# Altium footprint library Generic Footprint.PcbLib: 160 footprints (part 12 of 20)
Each footprint in its own frame and in the unit in brackets; x right, y up, seen from the top. Pads: shape width x height; smd on the part's side, far side on the other; paste and mask are expansions set on the pad; w line width, h text height; cw(c..) or ccw(c..) is an arc to the next point about the centre after c.
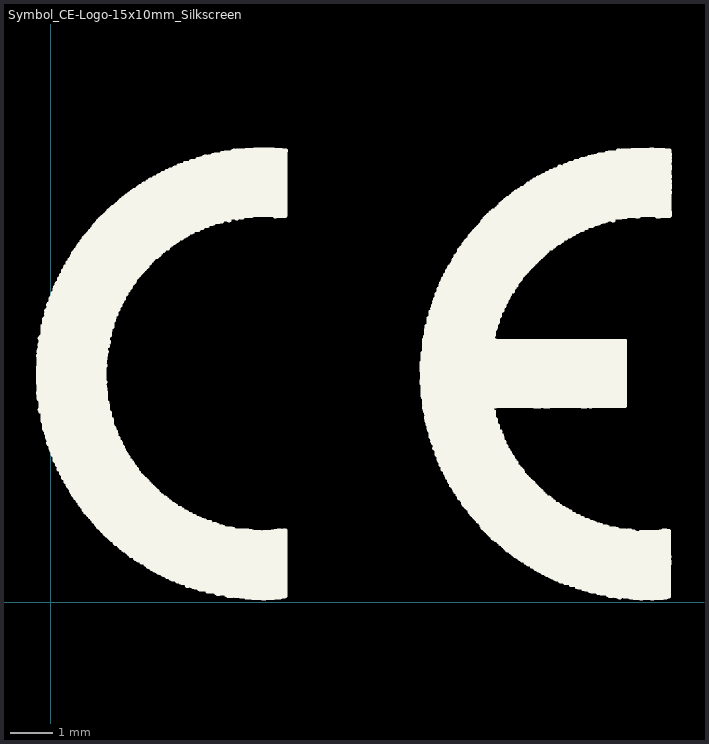
[diagram p11: the footprint, top view; thin cyan lines are the x and y axes]

## Symbol_CE-Logo-15x10mm_Silkscreen [mil]
pads (3108):
  round 3.94 on Top Overlay: 1(-11.54,192.48) 1(-11.54,201.34) 1(-11.54,201.93) 1(-11.54,202.52) 1(-11.54,203.11) 1(-11.54,203.7) 1(-11.54,204.29) 1(-11.54,204.88) 1(-11.54,206.65) 1(-11.54,207.24) 1(-11.54,207.83) 1(-11.54,208.43) 1(-11.54,209.02) 1(-11.54,209.61) 1(-11.54,210.2) 1(-11.54,210.79) 1(-11.54,211.38) 1(-11.54,211.97) 1(-11.54,212.56) 1(-11.54,213.15) 1(-11.54,213.74) 1(-11.54,214.33) 1(-11.54,214.92) 1(-11.54,215.51) 1(-11.54,216.1) 1(-11.54,226.73) 1(-10.95,187.76) 1(-10.95,188.35) 1(-10.95,188.94) 1(-10.95,189.53) 1(-10.95,190.12) 1(-10.95,193.07) 1(-10.95,193.66) 1(-10.95,194.25) 1(-10.95,194.84) 1(-10.95,195.43) 1(-10.95,196.02) 1(-10.95,196.61) 1(-10.95,197.2) 1(-10.95,197.8) 1(-10.95,198.39) 1(-10.95,198.98) 1(-10.95,199.57) 1(-10.95,200.16) 1(-10.95,200.75) 1(-10.95,205.47) 1(-10.95,206.06) 1(-10.95,216.69) 1(-10.95,217.28) 1(-10.95,217.87) 1(-10.95,218.46) 1(-10.95,219.06) 1(-10.95,219.65) 1(-10.95,220.24) 1(-10.95,220.83) 1(-10.95,221.42) 1(-10.95,222.01) 1(-10.95,222.6) 1(-10.95,223.19) 1(-10.95,223.78) 1(-10.95,224.37) 1(-10.95,224.96) 1(-10.95,225.55) 1(-10.95,226.14) 1(-10.95,230.28) 1(-10.95,230.87) 1(-10.36,186.57) 1(-10.36,187.17) 1(-10.36,190.71) 1(-10.36,191.3) 1(-10.36,191.89) 1(-10.36,227.32) 1(-10.36,227.91) 1(-10.36,228.5) 1(-10.36,229.09) 1(-10.36,229.69) 1(-10.36,231.46) 1(-10.36,232.05) 1(-10.36,232.64) 1(-9.77,177.13) 1(-9.77,233.23) 1(-9.77,236.18) 1(-9.77,236.77) 1(-9.77,237.36) 1(-9.77,242.68) 1(-9.18,175.35) 1(-9.18,175.94) 1(-9.18,176.54) 1(-9.18,178.9) 1(-9.18,179.49) 1(-9.18,180.08) 1(-9.18,180.67) 1(-9.18,181.26) 1(-9.18,181.85) 1(-9.18,182.44) 1(-9.18,183.03) 1(-9.18,183.62) 1(-9.18,184.21) 1(-9.18,184.8) 1(-9.18,185.39) 1(-9.18,185.98) 1(-9.18,233.82) 1(-9.18,234.41) 1(-9.18,235) 1(-9.18,235.59) 1(-9.18,237.95) 1(-9.18,238.54) 1(-9.18,239.13) 1(-9.18,239.72) 1(-9.18,240.31) 1(-8.59,177.72) 1(-8.59,178.31) 1(-8.59,240.91) 1(-8.59,241.5) 1(-8.59,242.09) 1(-8.59,243.27) 1(-8.59,243.86) 1(-8.59,244.45) 1(-7.41,167.09) 1(-7.41,167.68) 1(-7.41,168.27) 1(-7.41,168.86) 1(-7.41,169.45) 1(-7.41,170.04) 1(-7.41,170.63) 1(-7.41,171.22) 1(-7.41,171.81) 1(-7.41,172.4) 1(-7.41,172.99) 1(-7.41,173.58) 1(-7.41,174.76) 1(-7.41,245.04) 1(-7.41,245.63) 1(-7.41,246.22) 1(-7.41,246.81) 1(-7.41,247.4) 1(-7.41,247.99) 1(-7.41,248.58) 1(-7.41,249.17) 1(-7.41,249.76) 1(-7.41,250.35) 1(-7.41,250.94) 1(-7.41,251.54) 1(-7.41,253.9) 1(-6.82,165.91) 1(-6.82,166.5) 1(-6.82,174.17) 1(-6.82,252.13) 1(-6.82,252.72) 1(-6.82,253.31) 1(-5.63,159.41) 1(-5.63,160.59) 1(-5.63,161.18) 1(-5.63,161.77) 1(-5.63,162.36) 1(-5.63,162.95) 1(-5.63,163.54) 1(-5.63,164.13) 1(-5.63,164.72) 1(-5.63,165.31) 1(-5.63,254.49) 1(-5.63,255.08) 1(-5.63,255.67) 1(-5.63,256.26) 1(-5.63,256.85) 1(-5.63,257.44) 1(-5.63,258.03) 1(-5.63,258.62) 1(-5.63,259.21) 1(-5.63,260.39) 1(-5.04,158.23) 1(-5.04,158.82) 1(-5.04,160) 1(-5.04,259.8) 1(-5.04,260.98) 1(-4.45,261.57) 1(-3.86,155.28) 1(-3.86,155.87) 1(-3.86,156.46) 1(-3.86,157.64) 1(-3.86,264.53) 1(-3.86,265.12) 1(-3.86,265.71) 1(-3.86,268.07) 1(-3.27,151.73) 1(-3.27,152.32) 1(-3.27,152.91) 1(-3.27,153.5) 1(-3.27,154.09) 1(-3.27,154.68) 1(-3.27,157.05) 1(-3.27,262.17) 1(-3.27,262.76) 1(-3.27,263.35) 1(-3.27,263.94) 1(-3.27,266.3) 1(-3.27,266.89) 1(-3.27,267.48) 1(-2.68,150.55) 1(-2.68,151.14) 1(-2.68,268.66) 1(-2.68,269.25) 1(-2.09,146.42) 1(-2.09,273.39) 1(-1.5,145.24) 1(-1.5,145.83) 1(-1.5,147.01) 1(-1.5,147.6) 1(-1.5,148.19) 1(-1.5,148.78) 1(-1.5,149.37) 1(-1.5,149.96) 1(-1.5,269.84) 1(-1.5,270.43) 1(-1.5,271.02) 1(-1.5,271.61) 1(-1.5,272.2) 1(-1.5,272.8) 1(-1.5,274.57) 1(-0.91,144.65) 1(-0.91,273.98) 1(0.27,141.1) 1(0.27,141.69) 1(0.27,142.28) 1(0.27,142.87) 1(0.27,143.46) 1(0.27,144.06) 1(0.27,275.16) 1(0.27,275.75) 1(0.27,276.34) 1(0.27,276.93) 1(0.27,277.52) 1(0.27,278.11) 1(0.27,278.7) 1(0.27,279.29) 1(0.86,139.33) 1(0.86,139.92) 1(0.86,140.51) 1(0.86,279.88) 1(0.86,280.47) 1(1.45,138.74) 1(2.04,135.79) 1(2.04,136.97) 1(2.04,138.15) 1(2.04,281.06) 1(2.04,281.65) 1(2.04,282.83) 1(2.04,284.02) 1(2.63,136.38) 1(2.63,137.56) 1(2.63,282.24) 1(2.63,283.43) 1(3.22,135.2) 1(3.81,130.47) 1(3.81,131.06) 1(3.81,131.65) 1(3.81,132.24) 1(3.81,132.83) 1(3.81,133.43) 1(3.81,134.02) 1(3.81,134.61) 1(3.81,284.61) 1(3.81,285.2) 1(3.81,285.79) 1(3.81,286.38) 1(3.81,286.97) 1(3.81,287.56) 1(3.81,288.15) 1(4.4,129.88) 1(4.4,288.74) 1(4.4,289.92) 1(5,129.29) 1(5,289.33) 1(5.59,290.51) 1(5.59,292.28) 1(6.18,126.34) 1(6.18,126.93) 1(6.18,127.52) 1(6.18,128.11) 1(6.18,128.7) 1(6.18,291.1) 1(6.18,291.69) 1(6.18,292.87) 1(6.18,293.46) 1(6.77,125.75) 1(7.36,122.2) 1(7.36,294.06) 1(7.95,122.8) 1(7.95,123.39) 1(7.95,123.98) 1(7.95,124.57) 1(7.95,125.16) 1(7.95,294.65) 1(7.95,295.24) 1(7.95,295.83) 1(7.95,296.42) 1(7.95,297.01) 1(7.95,297.6) 1(9.13,121.61) 1(9.72,118.66) 1(9.72,119.25) 1(9.72,119.84) 1(9.72,120.43) 1(9.72,121.02) 1(9.72,298.19) 1(9.72,298.78) 1(9.72,299.37) 1(9.72,299.96) 1(9.72,300.55) 1(10.31,118.07) 1(10.31,301.14) 1(11.49,114.53) 1(11.49,115.12) 1(11.49,115.71) 1(11.49,116.3) 1(11.49,116.89) 1(11.49,117.48) 1(11.49,301.73) 1(11.49,302.32) 1(11.49,302.91) 1(11.49,303.5) 1(11.49,304.09) 1(11.49,304.69) 1(12.08,305.28) 1(12.67,113.94) 1(13.26,113.35) 1(13.26,305.87) 1(13.26,306.46) 1(13.26,307.64) 1(13.85,110.98) 1(13.85,111.57) 1(13.85,112.17) 1(13.85,112.76) 1(13.85,307.05) 1(13.85,308.23) 1(13.85,308.82) 1(14.44,110.39) 1(15.63,108.03) 1(15.63,108.62) 1(15.63,109.21) 1(15.63,109.8) 1(15.63,309.41) 1(15.63,310) 1(15.63,310.59) 1(15.63,311.18) 1(15.63,311.77) 1(15.63,312.36) 1(16.22,106.85) 1(16.22,107.44) 1(16.81,312.95) 1(17.4,105.67) 1(17.4,106.26) 1(17.4,313.54) 1(17.4,314.13) 1(17.4,314.72) 1(17.99,105.08) 1(19.17,102.13) 1(19.17,102.72) 1(19.17,103.31) 1(19.17,103.9) 1(19.17,104.49) 1(19.17,315.31) 1(19.17,315.91) 1(19.17,316.5) 1(19.76,100.94) 1(19.76,101.54) 1(19.76,317.09) 1(19.76,317.68) 1(19.76,318.27) 1(20.94,98.58) 1(20.94,99.17) 1(20.94,99.76) 1(20.94,100.35) 1(20.94,318.86) 1(20.94,319.45) 1(20.94,320.04) 1(20.94,320.63) 1(20.94,321.22) 1(21.53,97.99) 1(21.53,321.81) 1(22.12,97.4) 1(22.12,322.4) 1(22.71,96.22) 1(22.71,96.81) 1(22.71,322.4) 1(23.3,95.63) 1(23.3,322.4) 1(23.3,322.99) 1(23.3,323.58) 1(23.3,324.17) 1(24.48,324.76) 1(25.07,93.27) 1(25.07,93.86) 1(25.07,94.45) 1(25.07,95.04) 1(25.07,325.35) 1(25.07,325.94) 1(25.07,326.54) 1(25.66,327.13) 1(25.66,327.72) 1(26.85,90.31) 1(26.85,90.91) 1(26.85,91.5) 1(26.85,92.09) 1(26.85,92.68) 1(26.85,328.31) 1(26.85,328.9) 1(26.85,329.49) 1(27.44,89.72) 1(28.62,88.54) 1(28.62,89.13) 1(28.62,330.08) 1(28.62,330.67) 1(28.62,331.85) 1(29.21,87.95) 1(29.21,331.26) 1(30.39,85.59) 1(30.39,86.18) 1(30.39,86.77) 1(30.39,87.36) 1(30.39,332.44) 1(30.39,333.03) 1(30.39,333.62) 1(30.39,334.21) 1(30.98,84.41) 1(30.98,85) 1(30.98,334.8) 1(30.98,335.39) 1(32.16,82.64) 1(32.16,83.82) 1(32.16,335.98) 1(32.75,83.23) 1(32.75,336.57) 1(32.75,337.17) 1(33.34,82.05) 1(34.52,80.28) 1(34.52,80.87) 1(34.52,81.46) 1(34.52,337.76) 1(34.52,338.35) 1(34.52,338.94) 1(35.11,339.53) 1(36.29,78.5) 1(36.29,79.09) 1(36.29,79.68) 1(36.29,340.12) 1(36.29,340.71) 1(36.29,341.3) 1(38.07,76.73) 1(38.07,77.32) 1(38.07,77.91) 1(38.07,341.89) 1(38.07,342.48) 1(38.07,343.07) 1(39.25,76.14) 1(39.84,74.37) 1(39.84,74.96) 1(39.84,75.55) 1(39.84,343.66) 1(39.84,344.25) 1(39.84,344.84) 1(39.84,345.43) 1(40.43,346.02) 1(40.43,346.61) 1(41.02,74.37) 1(41.61,72.6) 1(41.61,74.37) 1(41.61,347.2) 1(42.2,71.42) 1(42.2,72.01) 1(42.2,73.19) 1(42.2,73.78) 1(42.2,347.8) 1(42.2,348.39) 1(42.79,70.83) 1(42.79,348.98) 1(43.97,69.06) 1(43.97,69.65) 1(43.97,70.24) 1(43.97,349.57) 1(43.97,350.16) 1(43.97,350.75) 1(45.15,68.46) 1(45.74,351.34) 1(45.74,351.93) 1(45.74,352.52) 1(46.33,67.28) 1(46.33,67.87) 1(46.92,66.69) 1(47.52,65.51) 1(47.52,66.1) 1(47.52,353.11) 1(47.52,353.7) 1(47.52,354.29) 1(48.7,64.92) 1(49.29,64.33) 1(49.29,199.57) 1(49.29,200.16) 1(49.29,200.75) 1(49.29,201.34) 1(49.29,203.7) 1(49.29,204.29) 1(49.29,204.88) 1(49.29,205.47) 1(49.29,206.06) 1(49.29,206.65) 1(49.29,207.24) 1(49.29,207.83) 1(49.29,208.43) 1(49.29,209.02) 1(49.29,209.61) 1(49.29,210.2) 1(49.29,210.79) 1(49.29,211.38) 1(49.29,211.97) 1(49.29,212.56) 1(49.29,213.15) 1(49.29,213.74) 1(49.29,214.33) 1(49.29,214.92) 1(49.29,215.51) 1(49.29,216.1) 1(49.29,218.46) 1(49.29,219.06) 1(49.29,219.65) 1(49.29,220.24) 1(49.29,354.88) 1(49.29,355.47) 1(49.88,63.15) 1(49.88,63.74) 1(49.88,197.2) 1(49.88,197.8) 1(49.88,198.39) 1(49.88,198.98) 1(49.88,201.93) 1(49.88,203.11) 1(49.88,216.69) 1(49.88,220.83) 1(49.88,221.42) 1(49.88,222.01) 1(49.88,222.6) 1(49.88,223.19) 1(49.88,356.06) 1(50.47,191.3) 1(50.47,191.89) 1(50.47,192.48) 1(50.47,193.66) 1(50.47,194.25) 1(50.47,194.84) 1(50.47,195.43) 1(50.47,196.02) 1(50.47,196.61) 1(50.47,202.52) 1(50.47,217.28) 1(50.47,217.87) 1(50.47,223.78) 1(50.47,224.37) 1(50.47,224.96) 1(50.47,225.55) 1(50.47,226.14) 1(50.47,226.73) 1(50.47,227.91) 1(50.47,228.5) 1(50.47,229.09) 1(50.47,229.69) 1(50.47,232.05) 1(50.47,235) 1(51.06,184.21) 1(51.06,184.8) 1(51.06,185.39) 1(51.06,185.98) 1(51.06,186.57) 1(51.06,187.17) 1(51.06,187.76) 1(51.06,188.35) 1(51.06,188.94) 1(51.06,189.53) 1(51.06,190.12) 1(51.06,190.71) 1(51.06,193.07) 1(51.06,227.32) 1(51.06,230.87) 1(51.06,231.46) 1(51.06,232.64) 1(51.06,233.23) 1(51.06,233.82) 1(51.06,234.41) 1(51.06,356.65) 1(51.65,61.38) 1(51.65,61.97) 1(51.65,62.56) 1(51.65,230.28) 1(51.65,235.59) 1(51.65,357.24) 1(51.65,357.83) 1(52.24,180.08) 1(52.24,181.85) 1(52.24,182.44) 1(52.24,183.03) 1(52.24,183.62) 1(52.24,235.59) 1(52.24,236.18) 1(52.24,236.77) 1(52.24,237.36) 1(52.24,358.43) 1(52.83,174.76) 1(52.83,175.35) 1(52.83,175.94) 1(52.83,176.54) 1(52.83,177.13) 1(52.83,177.72) 1(52.83,178.31) 1(52.83,178.9) 1(52.83,179.49) 1(52.83,180.67) 1(52.83,181.26) 1(52.83,235.59) 1(52.83,237.95) 1(52.83,240.31) 1(52.83,240.91) 1(52.83,241.5) 1(52.83,242.09) 1(52.83,242.68) 1(52.83,243.27) 1(52.83,243.86) 1(52.83,244.45) 1(53.42,60.2) 1(53.42,60.79) 1(53.42,238.54) 1(53.42,239.13) 1(53.42,239.72) 1(53.42,245.04) 1(53.42,359.02) 1(53.42,359.61) 1(53.42,360.2) 1(54.01,59.61) 1(54.01,173.58) 1(54.01,246.81) 1(54.6,59.02) 1(54.6,168.86) 1(54.6,169.45) 1(54.6,170.04) 1(54.6,170.63) 1(54.6,171.22) 1(54.6,171.81) 1(54.6,172.4) 1(54.6,172.99) 1(54.6,174.17) 1(54.6,245.63) 1(54.6,246.22) 1(54.6,247.4) 1(54.6,247.99) 1(54.6,248.58) 1(54.6,249.17) 1(54.6,249.76) 1(54.6,252.13) 1(55.19,58.43) 1(55.19,250.35) 1(55.19,250.94) 1(55.19,251.54) 1(55.19,360.79) 1(55.19,361.38) 1(55.78,57.83) 1(55.78,167.09) 1(55.78,167.68) 1(55.78,252.72) 1(55.78,361.97) 1(56.37,57.24) 1(56.37,161.77) 1(56.37,162.95) 1(56.37,163.54) 1(56.37,164.13) 1(56.37,164.72) 1(56.37,165.31) 1(56.37,165.91) 1(56.37,166.5) 1(56.37,168.27) 1(56.37,253.9) 1(56.37,255.67) 1(56.37,256.26) 1(56.37,256.85) 1(56.96,161.18) 1(56.96,162.36) 1(56.96,253.31) 1(56.96,254.49) 1(56.96,255.08) 1(56.96,257.44) 1(56.96,258.03) 1(56.96,362.56) 1(56.96,363.15) 1(57.55,258.62) 1(58.15,158.23) 1(58.15,160) 1(58.15,160.59) 1(58.15,259.21) 1(58.15,259.8) 1(58.15,260.39) 1(58.15,260.98) 1(58.15,262.17) 1(58.15,263.35) 1(58.15,363.74) 1(58.74,55.47) 1(58.74,157.64) 1(58.74,158.82) 1(58.74,159.41) 1(58.74,261.57) 1(58.74,262.76) 1(58.74,263.94) 1(59.33,54.29) 1(59.33,54.88) 1(59.33,56.06) 1(59.33,56.65) 1(59.92,53.7) 1(59.92,152.32) 1(59.92,153.5) 1(59.92,155.28) 1(59.92,155.87) 1(59.92,156.46) 1(59.92,157.05) 1(59.92,265.12) 1(59.92,266.89) 1(60.51,151.73) 1(60.51,152.91) 1(60.51,154.09) 1(60.51,154.68) 1(60.51,264.53) 1(60.51,265.71) 1(60.51,266.3) 1(60.51,267.48) 1(60.51,364.33) 1(60.51,365.51) 1(61.1,268.07) 1(61.1,364.92) 1(61.1,366.1) 1(61.69,268.66) 1(62.28,148.19) 1(62.28,148.78) 1(62.28,149.37) 1(62.28,149.96) 1(62.28,150.55) 1(62.28,151.14) 1(62.28,269.25) 1(62.28,269.84) 1(62.28,270.43) 1(62.28,271.02) 1(62.87,51.93) 1(62.87,52.52) 1(62.87,53.11) 1(62.87,271.61) 1(62.87,366.69) 1(62.87,367.28) 1(62.87,367.87) 1(63.46,272.2) 1(64.05,144.65) 1(64.05,145.24) 1(64.05,145.83) 1(64.05,147.01) 1(64.05,147.6) 1(64.05,272.8) 1(64.05,273.39) 1(64.05,273.98) 1(64.05,274.57) 1(64.64,50.16) 1(64.64,50.75) 1(64.64,51.34) 1(64.64,144.06) 1(64.64,146.42) 1(64.64,275.16) 1(64.64,368.46) 1(64.64,369.06) 1(64.64,369.65) 1(65.23,275.75) 1(65.82,49.57) 1(65.82,143.46) 1(65.82,276.34) 1(65.82,276.93) 1(65.82,277.52) 1(66.41,48.98) 1(66.41,140.51) 1(66.41,141.1) 1(66.41,141.69) 1(66.41,142.28) 1(66.41,142.87) 1(66.41,278.11) 1(66.41,278.7) 1(66.41,370.24) 1(67,48.39) 1(67,370.83) 1(67,371.42) 1(67.59,47.8) 1(67.59,137.56) 1(67.59,138.74) 1(67.59,139.33) 1(67.59,139.92) 1(67.59,279.29) 1(67.59,279.88) 1(67.59,280.47) 1(67.59,281.06) 1(67.59,281.65) 1(68.18,47.8) 1(68.18,136.97) 1(68.18,138.15) 1(68.18,282.24) 1(68.18,282.83) 1(68.18,372.01) 1(68.78,47.8) 1(68.78,372.6) 1(69.37,47.8) 1(69.37,135.2) 1(69.37,136.38) 1(69.37,283.43) 1(69.37,373.19) 1(69.96,47.8) 1(69.96,134.61) 1(69.96,135.79) 1(69.96,284.02) 1(69.96,284.61) 1(69.96,285.2) 1(69.96,285.79) 1(69.96,286.38) 1(69.96,373.78) 1(70.55,46.02) 1(70.55,46.61) 1(70.55,47.2) 1(70.55,373.78) 1(71.14,46.02) 1(71.14,134.02) 1(71.73,46.02) 1(71.73,131.06) 1(71.73,131.65) 1(71.73,132.24) 1(71.73,132.83) 1(71.73,133.43) 1(71.73,286.97) 1(71.73,287.56) 1(71.73,288.15) 1(72.32,44.25) 1(72.32,44.84) 1(72.32,45.43) 1(72.32,288.74) 1(72.32,373.78) 1(72.32,374.37) 1(72.32,374.96) 1(72.32,375.55) 1(73.5,129.88) 1(73.5,130.47) 1(73.5,289.33) 1(73.5,289.92) 1(74.09,42.48) 1(74.09,43.07) 1(74.09,43.66) 1(74.09,129.29) 1(74.09,290.51) 1(74.09,291.1) 1(74.09,291.69) 1(74.09,292.28) 1(74.09,376.14) 1(74.09,376.73) 1(74.68,128.7) 1(74.68,377.32) 1(75.27,126.34) 1(75.27,127.52) 1(75.27,128.11) 1(75.27,292.87) 1(75.86,125.16) 1(75.86,125.75) 1(75.86,126.93) 1(75.86,293.46) 1(75.86,294.06) 1(75.86,294.65) 1(76.45,294.65) 1(76.45,377.91) 1(76.45,378.5) 1(77.04,294.65) 1(77.04,295.24) 1(77.04,296.42) 1(77.04,297.6) 1(77.04,379.09) 1(77.63,40.71) 1(77.63,41.89) 1(77.63,123.39) 1(77.63,123.98) 1(77.63,124.57) 1(77.63,295.83) 1(77.63,297.01) 1(77.63,298.19) 1(78.22,40.12) 1(78.22,41.3) 1(78.81,122.8) 1(79.4,119.84) 1(79.4,120.43) 1(79.4,121.02) 1(79.4,121.61) 1(79.4,122.2) 1(79.4,298.78) 1(79.4,299.37) 1(80,38.94) 1(80,39.53) 1(80,119.25) 1(80,299.96) 1(80,379.69) 1(80,380.28) 1(80,380.87) 1(80.59,119.25) 1(80.59,381.46) 1(81.18,38.35) 1(81.18,118.07) 1(81.18,118.66) 1(81.18,119.25) 1(81.18,300.55) 1(81.18,301.14) 1(81.18,301.73) 1(81.18,381.46) 1(81.77,117.48) 1(81.77,381.46) 1(81.77,382.05) 1(82.36,302.32) 1(82.36,382.64) 1(82.95,116.89) 1(82.95,302.91) 1(83.54,37.17) 1(83.54,37.76) 1(83.54,115.71) 1(83.54,116.3) 1(83.54,303.5) 1(84.13,36.57) 1(84.13,304.09) 1(84.72,115.12) 1(84.72,304.69) 1(85.31,113.94) 1(85.31,114.53) 1(85.31,305.28) 1(85.31,305.87) 1(85.31,384.41) 1(85.9,383.23) 1(85.9,383.82) 1(85.9,385) 1(86.49,306.46) 1(87.08,112.17) 1(87.08,112.76) 1(87.08,113.35) 1(87.08,307.05) 1(87.08,307.64) 1(87.67,34.8) 1(87.67,35.39) 1(87.67,35.98) 1(88.26,308.23) 1(88.85,109.8) 1(88.85,110.39) 1(88.85,110.98) 1(88.85,111.57) 1(88.85,308.82) 1(88.85,309.41) 1(88.85,310) 1(88.85,310.59) 1(88.85,311.18) 1(89.44,33.03) 1(89.44,33.62) 1(89.44,34.21) 1(89.44,311.77) 1(89.44,385.59) 1(89.44,386.18) 1(89.44,386.77) 1(90.03,311.77) 1(90.63,32.44) 1(90.63,108.03) 1(90.63,109.21) 1(90.63,312.36) 1(90.63,312.95) 1(91.22,108.62) 1(91.22,311.77) 1(91.22,313.54) 1(91.22,387.36) 1(91.22,387.95) 1(91.81,32.44) 1(91.81,313.54) 1(91.81,388.54) 1(92.4,106.85) 1(92.4,107.44) 1(92.4,313.54) 1(92.4,314.72) 1(92.99,30.67) 1(92.99,31.26) 1(92.99,32.44) 1(92.99,106.26) 1(92.99,314.13) 1(92.99,315.31) 1(93.58,31.85) 1(94.17,105.67) 1(94.17,316.5) 1(94.76,105.08) 1(94.76,315.91) 1(94.76,317.09) 1(95.35,29.49) 1(95.35,30.08) 1(95.35,104.49) 1(95.35,389.13) 1(95.35,389.72) 1(95.35,390.32) 1(95.94,103.9) 1(96.53,102.72) 1(96.53,103.31) 1(97.12,28.9) 1(97.71,317.68) 1(98.3,100.94) 1(98.3,101.54) 1(98.3,102.13) 1(98.3,318.27) 1(98.3,318.86) 1(98.89,27.72) 1(98.89,28.31) 1(98.89,100.35) 1(98.89,390.91) 1(98.89,391.5) 1(98.89,392.09) 1(100.07,27.13) 1(100.07,98.58) 1(100.07,99.17) 1(100.07,99.76) 1(100.07,319.45) 1(100.07,320.04) 1(100.07,320.63) 1(100.07,392.68) 1(100.66,321.22) 1(101.85,97.4) 1(101.85,321.81) 1(101.85,322.4) 1(101.85,392.68) 1(102.44,26.54) 1(102.44,96.81) 1(102.44,97.99) 1(102.44,392.68) 1(102.44,393.27) 1(102.44,393.86) 1(103.03,25.94) 1(103.03,394.45) 1(103.62,25.35) 1(103.62,322.99) 1(103.62,324.17) 1(104.21,323.58) 1(104.21,324.76) 1(105.39,96.22) 1(105.98,24.76) 1(105.98,95.04) 1(105.98,95.63) 1(106.57,24.17) 1(106.57,395.04) 1(106.57,395.63) 1(106.57,396.22) 1(107.16,23.58) 1(107.16,94.45) 1(107.75,93.27) 1(107.75,93.86) 1(107.75,325.35) 1(107.75,325.94) 1(107.75,326.54) 1(108.34,92.68) 1(108.93,92.68) 1(108.93,327.13) 1(109.52,22.99) 1(109.52,91.5) 1(109.52,92.68) 1(109.52,327.72) 1(109.52,328.31) 1(110.11,22.4) 1(110.11,90.91) 1(110.11,92.09) 1(110.11,396.81) 1(110.11,397.4) 1(110.11,397.99) 1(110.7,21.81) 1(111.29,328.9) 1(111.29,329.49) 1(111.89,21.22) 1(111.89,330.08) 1(112.48,21.22) 1(112.48,330.67) 1(113.07,21.22) 1(113.07,90.31) 1(113.07,330.67) 1(113.66,89.72) 1(113.66,330.67) 1(113.66,398.58) 1(113.66,399.17) 1(114.25,89.13) 1(114.84,331.26) 1(114.84,399.76) 1(115.43,87.36) 1(115.43,87.95) 1(115.43,88.54) 1(115.43,331.85) 1(115.43,332.44) 1(116.02,20.04) 1(116.02,20.63) 1(116.02,332.44) 1(116.61,19.45) 1(116.61,332.44) 1(117.2,333.03) 1(117.2,333.62) 1(117.79,86.77) 1(117.79,334.21) 1(117.79,400.35) 1(117.79,400.94) 1(117.79,401.54) 1(118.38,86.77) 1(118.97,85.59) 1(118.97,86.18) 1(118.97,86.77) 1(119.56,18.27) 1(119.56,18.86) 1(120.15,402.13) 1(120.74,83.82) 1(120.74,334.8) 1(121.33,17.68) 1(121.33,83.23) 1(121.33,84.41) 1(121.33,85) 1(121.33,335.39) 1(121.33,335.98) 1(121.33,402.13) 1(121.92,402.13) 1(123.11,336.57) 1(123.11,402.72) 1(123.7,83.23) 1(123.7,403.31) 1(123.7,403.9) 1(124.29,83.23) 1(124.29,403.9) 1(124.88,17.09) 1(124.88,81.46) 1(124.88,82.05) 1(124.88,337.17) 1(124.88,337.76) 1(124.88,403.9) 1(125.47,15.31) 1(125.47,15.91) 1(125.47,16.5) 1(125.47,82.64) 1(126.06,338.35) 1(126.65,15.31) 1(126.65,338.94) 1(126.65,339.53) 1(127.24,340.12) 1(127.83,340.12) 1(129.01,15.31) 1(129.01,79.68) 1(129.01,80.28) 1(129.01,80.87) 1(129.01,404.49) 1(129.01,405.08) 1(129.6,15.31) 1(129.6,340.12) 1(129.6,405.67) 1(130.19,15.31) 1(130.19,341.3) 1(130.19,405.67) 1(130.78,340.71) 1(130.78,341.89) 1(130.78,405.67) 1(131.37,14.13) 1(131.37,14.72) 1(132.55,77.91) 1(132.55,78.5) 1(132.55,79.09) 1(133.15,13.54) 1(134.92,406.26) 1(134.92,406.85) 1(135.51,77.32) 1(135.51,407.44) 1(136.1,342.48) 1(136.1,343.07) 1(136.69,12.36) 1(136.69,12.95) 1(136.69,343.66) 1(137.28,76.73) 1(137.87,11.77) 1(137.87,76.14) 1(138.46,11.77) 1(138.46,408.03) 1(139.05,11.77) 1(139.05,408.03) 1(139.64,344.25) 1(139.64,344.84) 1(140.23,75.55) 1(140.23,345.43) 1(140.23,408.03) 1(140.23,408.62) 1(142,73.78) 1(142,74.37) 1(142,74.96) 1(142,409.21) 1(142,409.8) 1(142.59,409.8) 1(143.18,346.02) 1(143.78,73.78) 1(143.78,346.02) 1(143.78,346.61) 1(143.78,347.2) 1(144.37,10) 1(144.37,10.59) 1(144.37,11.18) 1(144.37,73.78) 1(144.37,346.02) 1(144.37,347.8) 1(144.96,347.8) 1(145.55,10) 1(145.55,409.8) 1(146.14,10) 1(146.14,73.78) 1(146.14,409.8) 1(146.73,73.19) 1(146.73,73.78) 1(147.32,72.01) 1(147.32,72.6) 1(147.91,347.8) 1(147.91,409.8) 1(148.5,410.39) 1(149.09,410.98) 1(149.68,348.39) 1(149.68,348.98) 1(150.27,349.57) 1(150.86,72.01) 1(150.86,349.57) 1(151.45,71.42) 1(151.45,72.01) 1(151.45,349.57) 1(151.45,411.57) 1(152.04,8.82) 1(152.04,9.41) 1(152.04,349.57) 1(153.22,349.57) 1(153.81,7.64) 1(153.81,8.23) 1(153.81,70.24) 1(153.81,70.83) 1(153.81,349.57) 1(154.4,7.64) 1(154.4,349.57) 1(156.18,350.16) 1(156.77,350.16) 1(157.36,69.65) 1(157.36,350.16) 1(157.36,350.75) 1(157.36,351.34) 1(157.36,412.76) 1(157.95,412.17) 1(159.13,68.46) 1(159.13,69.06) 1(160.31,413.35) 1(161.49,7.05) 1(161.49,7.64) 1(163.26,5.87) 1(163.26,6.46) 1(163.26,351.93) 1(163.85,5.87) 1(163.85,351.34) 1(163.85,351.93) 1(164.44,351.34) 1(164.44,351.93) 1(164.44,352.52) 1(165.03,353.11) 1(166.22,5.87) 1(166.22,67.87) 1(166.81,5.87) 1(167.4,413.94) 1(167.4,414.53) 1(167.99,67.28) 1(168.58,66.69) 1(168.58,415.12) 1(169.17,5.87) 1(169.17,66.1) 1(169.17,415.12) 1(169.76,66.1) 1(170.35,353.7) 1(170.94,5.87) 1(170.94,66.1) 1(170.94,353.11) 1(170.94,353.7) 1(171.53,353.11) 1(171.53,353.7) 1(171.53,415.12) 1(172.12,5.87) 1(172.12,66.1) 1(172.71,5.87) 1(173.3,5.87) 1(175.07,5.28) 1(175.07,66.1) 1(175.07,353.7) 1(175.66,66.1) 1(176.26,353.7) 1(176.26,354.29) 1(176.26,354.88) 1(176.85,66.1) 1(179.21,66.1) 1(179.8,4.68) 1(179.8,415.71) 1(180.98,65.51) 1(180.98,66.1) 1(181.57,355.47) 1(182.16,355.47) 1(182.16,415.71) 1(183.34,65.51) 1(183.93,65.51) 1(183.93,355.47) 1(184.52,355.47) 1(184.52,415.71) 1(185.11,355.47) 1(185.7,4.09) 1(185.7,64.92) 1(185.7,415.71) 1(186.29,64.33) 1(188.07,64.33) 1(188.07,415.71) 1(188.07,416.3) 1(189.84,64.33) 1(191.02,64.33) 1(193.38,64.33) 1(193.97,4.09) 1(194.56,4.09) 1(195.15,3.5) 1(195.74,3.5) 1(195.74,64.33) 1(196.33,3.5) 1(196.92,3.5) 1(201.06,64.33) 1(203.42,4.09) 1(203.42,64.33) 1(203.42,64.92) 1(204.01,4.09) 1(204.6,4.09) 1(204.6,416.3) 1(205.19,415.71) 1(206.37,65.51) 1(206.37,354.88) 1(206.37,355.47) 1(206.96,65.51) 1(206.96,354.88) 1(206.96,415.71) 1(207.55,355.47) 1(208.15,355.47) 1(208.74,415.71) 1(209.33,65.51) 1(209.33,66.1) 1(210.51,415.71) 1(211.1,4.68) 1(211.1,66.1) 1(212.28,415.71) 1(214.64,5.28) 1(214.64,66.1) 1(215.82,5.87) 1(215.82,6.46) 1(215.82,7.05) 1(215.82,7.64) 1(215.82,8.23) 1(215.82,8.82) 1(215.82,9.41) 1(215.82,10) 1(215.82,10.59) 1(215.82,11.18) 1(215.82,11.77) 1(215.82,12.36) 1(215.82,12.95) 1(215.82,13.54) 1(215.82,14.13) 1(215.82,14.72) 1(215.82,15.31) 1(215.82,15.91) 1(215.82,16.5) 1(215.82,17.09) 1(215.82,17.68) 1(215.82,18.27) 1(215.82,18.86) 1(215.82,19.45) 1(215.82,20.04) 1(215.82,20.63) 1(215.82,21.22) 1(215.82,21.81) 1(215.82,22.4) 1(215.82,22.99) 1(215.82,23.58) 1(215.82,24.17) 1(215.82,24.76) 1(215.82,25.35) 1(215.82,25.94) 1(215.82,26.54) 1(215.82,27.13) 1(215.82,27.72) 1(215.82,28.31) 1(215.82,28.9) 1(215.82,29.49) 1(215.82,30.08) 1(215.82,30.67) 1(215.82,31.26) 1(215.82,31.85) 1(215.82,32.44) 1(215.82,33.03) 1(215.82,33.62) 1(215.82,34.21) 1(215.82,34.8) 1(215.82,35.39) 1(215.82,35.98) 1(215.82,36.57) 1(215.82,37.17) 1(215.82,37.76) 1(215.82,38.35) 1(215.82,38.94) 1(215.82,39.53) 1(215.82,40.12) 1(215.82,40.71) 1(215.82,41.3) 1(215.82,41.89) 1(215.82,42.48) 1(215.82,43.07) 1(215.82,43.66) 1(215.82,44.25) 1(215.82,44.84) 1(215.82,45.43) 1(215.82,46.02) 1(215.82,46.61) 1(215.82,47.2) 1(215.82,47.8) 1(215.82,48.39) 1(215.82,48.98) 1(215.82,49.57) 1(215.82,50.16) 1(215.82,50.75) 1(215.82,51.34) 1(215.82,51.93) 1(215.82,52.52) 1(215.82,53.11) 1(215.82,53.7) 1(215.82,54.29) 1(215.82,54.88) 1(215.82,55.47) 1(215.82,56.06) 1(215.82,56.65) 1(215.82,57.24) 1(215.82,57.83) 1(215.82,58.43) 1(215.82,59.02) 1(215.82,59.61) 1(215.82,60.2) 1(215.82,60.79) 1(215.82,61.38) 1(215.82,61.97) 1(215.82,62.56) 1(215.82,63.15) 1(215.82,63.74) 1(215.82,64.33) 1(215.82,64.92) 1(215.82,65.51) 1(215.82,66.1) 1(215.82,355.47) 1(215.82,356.06) 1(215.82,356.65) 1(215.82,357.24) 1(215.82,357.83) 1(215.82,358.43) 1(215.82,359.02) 1(215.82,359.61) 1(215.82,360.2) 1(215.82,360.79) 1(215.82,361.38) 1(215.82,361.97) 1(215.82,362.56) 1(215.82,363.15) 1(215.82,363.74) 1(215.82,364.33) 1(215.82,364.92) 1(215.82,365.51) 1(215.82,366.1) 1(215.82,366.69) 1(215.82,367.28) 1(215.82,367.87) 1(215.82,368.46) 1(215.82,369.06) 1(215.82,369.65) 1(215.82,370.24) 1(215.82,370.83) 1(215.82,371.42) 1(215.82,372.01) 1(215.82,372.6) 1(215.82,373.19) 1(215.82,373.78) 1(215.82,374.37) 1(215.82,374.96) 1(215.82,375.55) 1(215.82,376.14) 1(215.82,376.73) 1(215.82,377.32) 1(215.82,377.91) 1(215.82,378.5) 1(215.82,379.09) 1(215.82,379.69) 1(215.82,380.28) 1(215.82,380.87) 1(215.82,381.46) 1(215.82,382.05) 1(215.82,382.64) 1(215.82,383.23) 1(215.82,383.82) 1(215.82,384.41) 1(215.82,385) 1(215.82,385.59) 1(215.82,386.18) 1(215.82,386.77) 1(215.82,387.36) 1(215.82,387.95) 1(215.82,388.54) 1(215.82,389.13) 1(215.82,389.72) 1(215.82,390.32) 1(215.82,390.91) 1(215.82,391.5) 1(215.82,392.09) 1(215.82,392.68) 1(215.82,393.27) 1(215.82,393.86) 1(215.82,394.45) 1(215.82,395.04) 1(215.82,395.63) 1(215.82,396.22) 1(215.82,396.81) 1(215.82,397.4) 1(215.82,397.99) 1(215.82,398.58) 1(215.82,399.17) 1(215.82,399.76) 1(215.82,400.35) 1(215.82,400.94) 1(215.82,401.54) 1(215.82,402.13) 1(215.82,402.72) 1(215.82,403.31) 1(215.82,403.9) 1(215.82,404.49) 1(215.82,405.08) 1(215.82,405.67) 1(215.82,406.26) 1(215.82,406.85) 1(215.82,407.44) 1(215.82,408.03) 1(215.82,408.62) 1(215.82,409.21) 1(215.82,409.8) 1(215.82,410.39) 1(215.82,410.98) 1(215.82,411.57) 1(215.82,412.17) 1(215.82,412.76) 1(215.82,413.35) 1(215.82,413.94) 1(215.82,414.53) 1(216.41,415.12) 1(341.02,201.34) 1(341.02,201.93) 1(341.02,202.52) 1(341.02,203.11) 1(341.02,203.7) 1(341.02,213.15) 1(341.02,213.74) 1(341.02,214.33) 1(341.02,215.51) 1(341.02,216.1) 1(341.02,216.69) 1(341.02,217.28) 1(341.02,217.87) 1(341.02,218.46) 1(341.02,219.06) 1(341.02,219.65) 1(341.02,220.24) 1(341.61,200.75) 1(341.61,204.29) 1(341.61,204.88) 1(341.61,205.47) 1(341.61,206.06) 1(341.61,206.65) 1(341.61,207.24) 1(341.61,207.83) 1(341.61,208.43) 1(341.61,209.02) 1(341.61,209.61) 1(341.61,210.2) 1(341.61,210.79) 1(341.61,211.38) 1(341.61,211.97) 1(341.61,212.56) 1(342.2,189.53) 1(342.2,190.12) 1(342.2,190.71) 1(342.2,191.3) 1(342.2,191.89) 1(342.2,192.48) 1(342.2,193.07) 1(342.2,193.66) 1(342.2,194.25) 1(342.2,194.84) 1(342.2,195.43) 1(342.2,196.02) 1(342.2,196.61) 1(342.2,197.2) 1(342.2,197.8) 1(342.2,198.39) 1(342.2,198.98) 1(342.2,199.57) 1(342.2,200.16) 1(342.2,214.92) 1(342.2,220.83) 1(342.2,221.42) 1(342.2,222.01) 1(342.2,222.6) 1(342.2,223.19) 1(342.2,223.78) 1(342.2,224.37) 1(342.2,224.96) 1(342.2,225.55) 1(342.2,226.14) 1(342.2,226.73) 1(342.2,227.32) 1(342.2,227.91) 1(342.2,228.5) 1(342.2,229.09) 1(342.79,188.35) 1(342.79,188.94) 1(343.38,178.9) 1(343.38,179.49) 1(343.38,181.85) 1(343.38,183.62) 1(343.38,184.8) 1(343.38,185.39) 1(343.38,185.98) 1(343.38,187.17) 1(343.38,187.76) 1(343.38,229.69) 1(343.38,230.87) 1(343.38,232.05) 1(343.38,232.64) 1(343.38,233.23) 1(343.38,233.82) 1(343.38,234.41) 1(343.38,235) 1(343.38,235.59) 1(343.38,236.18) 1(343.38,237.36) 1(343.38,239.72) 1(343.38,241.5) 1(343.97,177.13) 1(343.97,177.72) 1(343.97,178.31) 1(343.97,180.08) 1(343.97,180.67) 1(343.97,181.26) 1(343.97,182.44) 1(343.97,183.03) 1(343.97,184.21) 1(343.97,186.57) 1(343.97,230.28) 1(343.97,231.46) 1(343.97,236.77) 1(343.97,237.95) 1(343.97,238.54) 1(343.97,239.13) 1(343.97,240.31) 1(343.97,240.91) 1(343.97,242.09) 1(344.56,175.35) 1(344.56,175.94) 1(344.56,176.54) 1(344.56,242.68) 1(344.56,243.27) 1(344.56,243.86) 1(344.56,244.45) 1(345.15,169.45) 1(345.15,170.04) 1(345.15,173.58) 1(345.15,245.04) 1(345.15,245.63) 1(345.15,246.81) 1(345.15,249.17) 1(345.15,250.35) 1(345.74,167.09) 1(345.74,167.68) 1(345.74,168.27) 1(345.74,168.86) 1(345.74,170.63) 1(345.74,171.22) 1(345.74,171.81) 1(345.74,172.4) 1(345.74,172.99) 1(345.74,174.17) 1(345.74,174.76) 1(345.74,246.22) 1(345.74,247.4) 1(345.74,247.99) 1(345.74,248.58) 1(345.74,249.76) 1(345.74,250.94) 1(345.74,251.54) 1(345.74,253.9) 1(346.33,165.91) 1(346.33,166.5) 1(346.33,252.13) 1(346.33,252.72) 1(346.33,253.31) 1(346.92,163.54) 1(346.92,165.31) 1(347.52,160) 1(347.52,160.59) 1(347.52,161.18) 1(347.52,161.77) 1(347.52,162.36) 1(347.52,162.95) 1(347.52,164.13) 1(347.52,164.72) 1(347.52,254.49) 1(347.52,255.08) 1(347.52,255.67) 1(347.52,256.26) 1(347.52,256.85) 1(347.52,257.44) 1(347.52,258.03) 1(347.52,258.62) 1(347.52,259.21) 1(347.52,260.98) 1(348.11,158.23) 1(348.11,158.82) 1(348.11,159.41) 1(348.11,259.8) 1(348.11,260.39) 1(348.7,157.64) 1(348.7,261.57) 1(349.29,152.32) 1(349.29,153.5) 1(349.29,154.09) 1(349.29,154.68) 1(349.29,155.28) 1(349.29,155.87) 1(349.29,156.46) 1(349.29,157.05) 1(349.29,262.17) 1(349.29,262.76) 1(349.29,263.35) 1(349.29,263.94) 1(349.29,264.53) 1(349.29,265.12) 1(349.29,266.3) 1(349.29,266.89) 1(349.88,152.91) 1(349.88,265.71) 1(351.06,148.19) 1(351.06,149.96) 1(351.06,150.55) 1(351.06,151.14) 1(351.06,151.73) 1(351.06,267.48) 1(351.06,269.84) 1(351.65,146.42) 1(351.65,147.01) 1(351.65,147.6) 1(351.65,148.78) 1(351.65,149.37) 1(351.65,268.07) 1(351.65,268.66) 1(351.65,269.25) 1(351.65,270.43) 1(351.65,271.02) 1(351.65,271.61) 1(351.65,272.2) 1(351.65,272.8) 1(352.83,141.69) 1(352.83,145.24) 1(352.83,273.39) 1(352.83,273.98) 1(352.83,274.57) 1(352.83,276.34) 1(353.42,141.1) 1(353.42,142.28) 1(353.42,142.87) 1(353.42,143.46) 1(353.42,144.06) 1(353.42,144.65) 1(353.42,145.83) 1(353.42,275.16) 1(353.42,275.75) 1(353.42,276.93) 1(353.42,277.52) 1(353.42,278.11) 1(353.42,278.7) 1(354.6,140.51) 1(355.19,135.79) 1(355.19,136.38) 1(355.19,136.97) 1(355.19,137.56) 1(355.19,138.15) 1(355.19,138.74) 1(355.19,139.33) 1(355.19,139.92) 1(355.19,279.29) 1(355.19,279.88) 1(355.19,280.47) 1(355.19,281.06) 1(355.19,281.65) 1(355.19,282.24) 1(355.19,282.83) 1(355.19,283.43) 1(355.78,135.2) 1(355.78,284.02) 1(356.37,284.61) 1(356.96,131.06) 1(356.96,131.65) 1(356.96,132.24) 1(356.96,132.83) 1(356.96,133.43) 1(356.96,134.02) 1(356.96,134.61) 1(356.96,285.2) 1(356.96,285.79) 1(356.96,286.38) 1(356.96,286.97) 1(356.96,287.56) 1(356.96,288.15) 1(357.55,129.88) 1(357.55,130.47) 1(358.74,126.34) 1(358.74,128.11) 1(358.74,129.29) 1(358.74,288.74) 1(358.74,289.33) 1(358.74,289.92) 1(358.74,290.51) 1(358.74,291.1) 1(358.74,291.69) 1(359.33,126.93) 1(359.33,127.52) 1(359.33,128.7) 1(359.33,292.28) 1(359.33,292.87) 1(359.33,293.46) 1(359.92,125.75) 1(360.51,122.2) 1(360.51,123.39) 1(360.51,124.57) 1(360.51,125.16) 1(360.51,294.06) 1(360.51,295.83) 1(361.1,122.8) 1(361.1,123.98) 1(361.1,294.65) 1(361.1,295.24) 1(361.1,296.42) 1(361.1,297.01) 1(361.1,297.6) 1(361.69,121.61) 1(362.28,121.02) 1(362.87,118.66) 1(362.87,119.25) 1(362.87,119.84) 1(362.87,120.43) 1(362.87,298.19) 1(362.87,298.78) 1(362.87,299.37) 1(362.87,299.96) 1(362.87,300.55) 1(362.87,301.14) 1(363.46,118.07) 1(364.05,116.3) 1(364.05,301.73) 1(364.64,114.53) 1(364.64,115.12) 1(364.64,115.71) 1(364.64,116.89) 1(364.64,117.48) 1(364.64,302.32) 1(364.64,302.91) 1(364.64,303.5) 1(364.64,304.09) 1(364.64,304.69) 1(365.23,305.28) 1(366.41,111.57) 1(366.41,112.17) 1(366.41,112.76) 1(366.41,113.35) 1(366.41,113.94) 1(366.41,305.87) 1(366.41,306.46) 1(366.41,307.05) 1(366.41,307.64) 1(367,110.39) 1(367,110.98) 1(367,308.23) 1(367,308.82) 1(368.18,107.44) 1(368.18,108.03) 1(368.18,309.41) 1(368.78,108.62) 1(368.78,109.21) 1(368.78,109.8) 1(368.78,310) 1(368.78,310.59) 1(369.37,106.85) 1(369.96,311.18) 1(369.96,312.36) 1(370.55,105.08) 1(370.55,105.67) 1(370.55,106.26) 1(370.55,311.77) 1(370.55,312.95) 1(370.55,313.54) 1(370.55,314.13) 1(370.55,314.72) 1(371.73,102.72) 1(371.73,103.31) 1(371.73,104.49) 1(371.73,315.91) 1(372.32,101.54) 1(372.32,102.13) 1(372.32,103.9) 1(372.32,315.31) 1(372.32,316.5) 1(372.32,317.09) 1(372.32,317.68) 1(372.32,318.27) 1(373.5,100.94) 1(374.09,99.17) 1(374.09,99.76) 1(374.09,100.35) 1(374.09,318.86) 1(374.09,319.45) 1(374.09,320.04) 1(375.86,95.63) 1(375.86,96.22) 1(375.86,96.81) 1(375.86,97.4) 1(375.86,97.99) 1(375.86,98.58) 1(375.86,320.63) 1(375.86,321.22) 1(375.86,321.81) 1(375.86,322.4) 1(375.86,322.99) 1(375.86,323.58) 1(375.86,324.17) 1(377.63,95.04) 1(377.63,324.76) 1(377.63,325.94) 1(378.22,93.86) 1(378.22,94.45) 1(378.22,325.35) 1(378.81,93.27) 1(379.41,90.91) 1(379.41,92.09) 1(379.41,92.68) 1(379.41,326.54) 1(379.41,327.72) 1(380,89.72) 1(380,90.31) 1(380,91.5) 1(380,327.13) 1(380,328.31) 1(380,328.9) 1(380,329.49) 1(380.59,330.08) 1(381.77,87.95) 1(381.77,88.54) 1(381.77,89.13) 1(381.77,330.67) 1(381.77,331.26) 1(381.77,331.85) 1(382.95,332.44) 1(383.54,86.18) 1(383.54,86.77) 1(383.54,87.36) 1(383.54,333.03) 1(383.54,333.62) 1(385.31,83.82) 1(385.31,84.41) 1(385.31,85.59) 1(385.31,334.21) 1(385.31,334.8) 1(385.31,335.39) 1(385.31,335.98) 1(385.9,82.64) 1(385.9,83.23) 1(385.9,85) 1(385.9,336.57) 1(385.9,337.17) 1(386.49,82.05) 1(387.08,80.87) 1(387.08,81.46) 1(387.08,337.76) 1(387.67,80.28) 1(387.67,338.35) 1(387.67,338.94) 1(388.26,339.53) 1(389.44,78.5) 1(389.44,79.09) 1(389.44,79.68) 1(389.44,340.12) 1(389.44,340.71) 1(389.44,341.3) 1(390.04,77.91) 1(391.22,76.73) 1(391.22,77.32) 1(391.22,341.89) 1(391.22,342.48) 1(391.22,343.07) 1(391.81,76.14) 1(392.99,74.37) 1(392.99,74.96) 1(392.99,75.55) 1(392.99,343.66) 1(392.99,344.25) 1(392.99,344.84) 1(394.76,73.78) 1(394.76,345.43) 1(394.76,346.61) 1(395.35,72.6) 1(395.35,73.19) 1(395.35,346.02) 1(396.53,70.24) 1(396.53,70.83) 1(396.53,71.42) 1(396.53,72.01) 1(396.53,347.2) 1(396.53,348.39) 1(397.12,68.46) 1(397.12,69.06) 1(397.12,69.65) 1(397.12,347.8) 1(397.12,348.98) 1(397.12,349.57) 1(397.12,350.16) 1(397.71,350.75) 1(398.3,67.87) 1(398.89,67.28) 1(398.89,351.34) 1(398.89,351.93) 1(398.89,352.52) 1(399.48,66.69) 1(400.07,66.1) 1(400.07,353.11) 1(400.66,65.51) 1(400.66,353.7) 1(400.66,354.29) 1(402.44,63.74) 1(402.44,64.33) 1(402.44,64.92) 1(402.44,354.88) 1(402.44,355.47) 1(402.44,356.06) 1(403.03,63.15) 1(404.21,61.97) 1(404.21,62.56) 1(404.21,356.65) 1(404.8,61.38) 1(404.8,357.24) 1(404.8,357.83) 1(404.8,358.43) 1(405.39,177.13) 1(405.39,178.9) 1(405.39,179.49) 1(405.39,241.5) 1(405.39,242.09) 1(405.98,60.79) 1(405.98,176.54) 1(405.98,177.72) 1(405.98,178.31) 1(405.98,180.08) 1(405.98,240.91) 1(405.98,242.68) 1(406.57,59.02) 1(406.57,59.61) 1(406.57,60.2) 1(406.57,175.94) 1(406.57,243.27) 1(406.57,243.86) 1(406.57,244.45) 1(406.57,359.02) 1(406.57,359.61) 1(407.16,174.76) 1(407.16,180.67) 1(407.16,245.04) 1(407.16,245.63) 1(407.16,360.2) 1(407.75,169.45) 1(407.75,170.04) 1(407.75,170.63) 1(407.75,171.22) 1(407.75,171.81) 1(407.75,172.4) 1(407.75,172.99) 1(407.75,173.58) 1(407.75,174.17) 1(407.75,175.35) 1(407.75,180.67) 1(407.75,240.91) 1(407.75,246.22) 1(407.75,246.81) 1(407.75,247.4) 1(407.75,247.99) 1(407.75,248.58) 1(407.75,249.17) 1(407.75,249.76) 1(407.75,250.35) 1(408.34,58.43) 1(408.34,168.86) 1(408.34,180.08) 1(408.34,240.91) 1(408.34,250.94) 1(408.93,57.83) 1(408.93,168.27) 1(408.93,180.08) 1(408.93,251.54) 1(408.93,252.13) 1(409.52,57.24) 1(409.52,162.95) 1(409.52,163.54) 1(409.52,164.13) 1(409.52,164.72) 1(409.52,165.31) 1(409.52,165.91) 1(409.52,166.5) 1(409.52,167.09) 1(409.52,167.68) 1(409.52,252.72) 1(409.52,253.31) 1(409.52,253.9) 1(409.52,254.49) 1(409.52,255.08) 1(409.52,255.67) 1(409.52,256.26) 1(410.11,360.79) 1(410.11,361.38) 1(410.11,361.97) 1(410.7,256.85) 1(410.7,257.44) 1(411.29,158.23) 1(411.29,158.82) 1(411.29,159.41) 1(411.29,160) 1(411.29,160.59) 1(411.29,161.18) 1(411.29,161.77) 1(411.29,162.36) 1(411.29,258.03) 1(411.29,258.62) 1(411.29,259.21) 1(411.29,259.8) 1(411.29,260.39) 1(411.29,260.98) 1(411.29,261.57) 1(411.29,262.17) 1(411.89,55.47) 1(411.89,56.06) 1(411.89,56.65) 1(411.89,157.64) 1(411.89,362.56) 1(411.89,363.15) 1(411.89,363.74) 1(412.48,262.76) 1(413.07,154.09) 1(413.07,154.68) 1(413.07,155.28) 1(413.07,155.87) 1(413.07,156.46) 1(413.07,263.35) 1(413.07,263.94) 1(413.07,264.53) 1(413.07,265.12) 1(413.07,265.71) 1(413.07,266.3) 1(413.07,266.89) 1(413.07,267.48) 1(413.66,53.7) 1(413.66,54.29) 1(413.66,54.88) 1(413.66,153.5) 1(413.66,157.05) 1(413.66,268.07) 1(413.66,364.33) 1(413.66,364.92) 1(413.66,365.51) 1(413.66,366.1) 1(414.25,153.5) 1(414.25,268.07) 1(414.25,366.1) 1(414.84,151.73) 1(414.84,152.32) 1(414.84,152.91) 1(414.84,153.5) 1(414.84,268.07) 1(415.43,53.11) 1(415.43,148.19) 1(415.43,148.78) 1(415.43,149.37) 1(415.43,149.96) 1(415.43,150.55) 1(415.43,151.14) 1(415.43,268.66) 1(415.43,269.25) 1(415.43,269.84) 1(415.43,270.43) 1(415.43,271.02) 1(415.43,271.61) 1(415.43,366.1) 1(415.43,366.69) 1(415.43,367.28) 1(416.02,51.93) 1(416.02,52.52) 1(416.02,367.87) 1(417.2,144.06) 1(417.2,144.65) 1(417.2,145.24) 1(417.2,145.83) 1(417.2,146.42) 1(417.2,147.01) 1(417.2,147.6) 1(417.2,272.2) 1(417.2,272.8) 1(417.2,273.39) 1(417.2,273.98) 1(417.2,274.57) 1(417.2,275.16) 1(417.79,50.16) 1(417.79,50.75) 1(417.79,51.34) 1(417.79,368.46) 1(417.79,369.06) 1(417.79,369.65) 1(418.38,49.57) 1(418.38,275.75) 1(418.97,49.57) 1(418.97,140.51) 1(418.97,141.1) 1(418.97,141.69) 1(418.97,142.28) 1(418.97,142.87) 1(418.97,143.46) 1(418.97,276.34) 1(418.97,276.93) 1(418.97,277.52) 1(418.97,278.11) 1(418.97,278.7) 1(419.56,48.39) 1(419.56,48.98) 1(419.56,49.57) 1(419.56,370.24) 1(419.56,370.83) 1(420.15,47.8) 1(420.15,279.29) 1(420.15,371.42) 1(420.74,138.74) 1(420.74,139.33) 1(420.74,139.92) 1(420.74,279.88) 1(420.74,280.47) 1(420.74,281.06) 1(420.74,282.24) 1(420.74,282.83) 1(421.33,281.65) 1(421.92,47.8) 1(421.92,138.15) 1(422.52,47.8) 1(422.52,135.2) 1(422.52,136.38) 1(422.52,136.97) 1(422.52,137.56) 1(422.52,283.43) 1(422.52,284.02) 1(422.52,284.61) 1(423.11,46.02) 1(423.11,47.2) 1(423.11,134.61) 1(423.11,135.79) 1(423.11,285.2) 1(423.11,372.01) 1(423.11,372.6) 1(423.11,373.19) 1(423.7,46.61) 1(424.29,134.02) 1(424.88,45.43) 1(424.88,131.06) 1(424.88,131.65) 1(424.88,132.24) 1(424.88,132.83) 1(424.88,133.43) 1(424.88,285.79) 1(424.88,286.38) 1(424.88,286.97) 1(424.88,287.56) 1(424.88,288.15) 1(424.88,288.74) 1(424.88,373.78) 1(425.47,44.25) 1(425.47,44.84) 1(425.47,374.37) 1(425.47,374.96) 1(425.47,375.55) 1(426.65,129.29) 1(426.65,129.88) 1(426.65,130.47) 1(426.65,289.33) 1(426.65,289.92) 1(426.65,290.51) 1(426.65,376.14) 1(427.24,42.48) 1(427.24,43.07) 1(427.24,43.66) 1(427.24,376.73) 1(427.83,128.7) 1(427.83,291.1) 1(427.83,377.32) 1(428.42,125.16) 1(428.42,125.75) 1(428.42,126.34) 1(428.42,126.93) 1(428.42,127.52) 1(428.42,128.11) 1(428.42,291.69) 1(428.42,292.28) 1(428.42,292.87) 1(428.42,293.46) 1(428.42,294.06) 1(429.01,41.89) 1(429.6,41.89) 1(429.6,294.65) 1(430.19,41.89) 1(430.19,123.98) 1(430.19,124.57) 1(430.19,295.24) 1(430.19,295.83) 1(430.78,40.71) 1(430.78,123.39) 1(430.78,377.91) 1(430.78,378.5) 1(430.78,379.09) 1(431.37,40.12) 1(431.37,41.3) 1(431.37,296.42) 1(431.96,122.8) 1(431.96,297.01) 1(431.96,297.6) 1(431.96,299.37) 1(432.55,39.53) 1(432.55,121.61) 1(432.55,122.2) 1(432.55,298.19) 1(432.55,298.78) 1(432.55,299.96) 1(432.55,379.69) 1(433.15,38.94) 1(433.15,380.28) 1(433.15,380.87) 1(433.74,38.35) 1(433.74,120.43) 1(433.74,121.02) 1(434.33,117.48) 1(434.33,118.07) 1(434.33,118.66) 1(434.33,119.25) 1(434.33,119.84) 1(434.33,300.55) 1(434.33,301.14) 1(434.33,301.73) 1(434.92,38.35) 1(435.51,38.35) 1(436.1,116.3) 1(436.1,116.89) 1(436.1,302.32) 1(436.1,302.91) 1(436.1,303.5) 1(436.1,381.46) 1(436.69,36.57) 1(436.69,37.17) 1(436.69,37.76) 1(436.69,115.71) 1(436.69,304.09) 1(436.69,382.05) 1(436.69,382.64) 1(437.28,304.09) 1(437.87,113.94) 1(437.87,114.53) 1(437.87,115.12) 1(437.87,304.09) 1(437.87,304.69) 1(437.87,305.28) 1(437.87,383.23) 1(438.46,35.39) 1(438.46,35.98) 1(438.46,383.82) 1(438.46,384.41) 1(439.05,305.87) 1(439.05,385) 1(439.64,34.8) 1(439.64,112.76) 1(439.64,113.35) 1(439.64,306.46) 1(439.64,307.05) 1(440.23,112.17) 1(440.23,307.64) 1(441.41,110.39) 1(441.41,111.57) 1(441.41,308.23) 1(441.41,309.41) 1(442,34.21) 1(442,110.98) 1(442,308.82) 1(442,385.59) 1(442,386.18) 1(442.59,33.03) 1(442.59,33.62) 1(442.59,109.8) 1(442.59,386.77) 1(443.18,109.8) 1(443.18,310) 1(443.78,108.03) 1(443.78,108.62) 1(443.78,109.21) 1(443.78,109.8) 1(443.78,310.59) 1(443.78,311.18) 1(443.78,387.36) 1(444.37,32.44) 1(444.37,311.77) 1(444.37,387.95) 1(444.96,32.44) 1(444.96,180.08) 1(444.96,388.54) 1(445.55,32.44) 1(445.55,106.26) 1(445.55,106.85) 1(445.55,107.44) 1(445.55,180.08) 1(445.55,312.36) 1(445.55,312.95) 1(446.14,30.67) 1(446.14,31.26) 1(446.14,31.85) 1(446.14,313.54) 1(447.32,104.49) 1(447.32,105.08) 1(447.32,105.67) 1(447.32,180.08) 1(447.32,314.13) 1(447.32,314.72) 1(447.32,315.31) 1(447.32,389.13) 1(447.91,30.08) 1(447.91,389.72) 1(447.91,390.32) 1(448.5,29.49) 1(448.5,180.08) 1(449.09,103.9) 1(449.09,180.08) 1(449.09,315.91) 1(449.09,316.5) 1(449.68,102.72) 1(449.68,103.31) 1(449.68,180.08) 1(449.68,317.09) 1(450.27,28.9) 1(450.27,390.91) 1(450.86,390.91) 1(451.45,100.35) 1(451.45,100.94) 1(451.45,101.54) 1(451.45,102.13) 1(451.45,317.68) 1(451.45,318.27) 1(451.45,318.86) 1(452.04,27.72) 1(452.04,28.31) 1(452.04,390.91) 1(452.04,391.5) 1(452.04,392.09) 1(452.63,27.13) 1(453.22,98.58) 1(453.22,99.17) 1(453.22,99.76) 1(453.22,319.45) 1(453.22,320.04) 1(453.22,320.63) 